# Altium footprint library Connector_art.PcbLib: 209 footprints (part 10 of 14)
Each footprint in its own frame and in the unit in brackets; x right, y up, seen from the top. Pads: shape width x height; smd on the part's side, far side on the other; paste and mask are expansions set on the pad; w line width, h text height; cw(c..) or ccw(c..) is an arc to the next point about the centre after c.
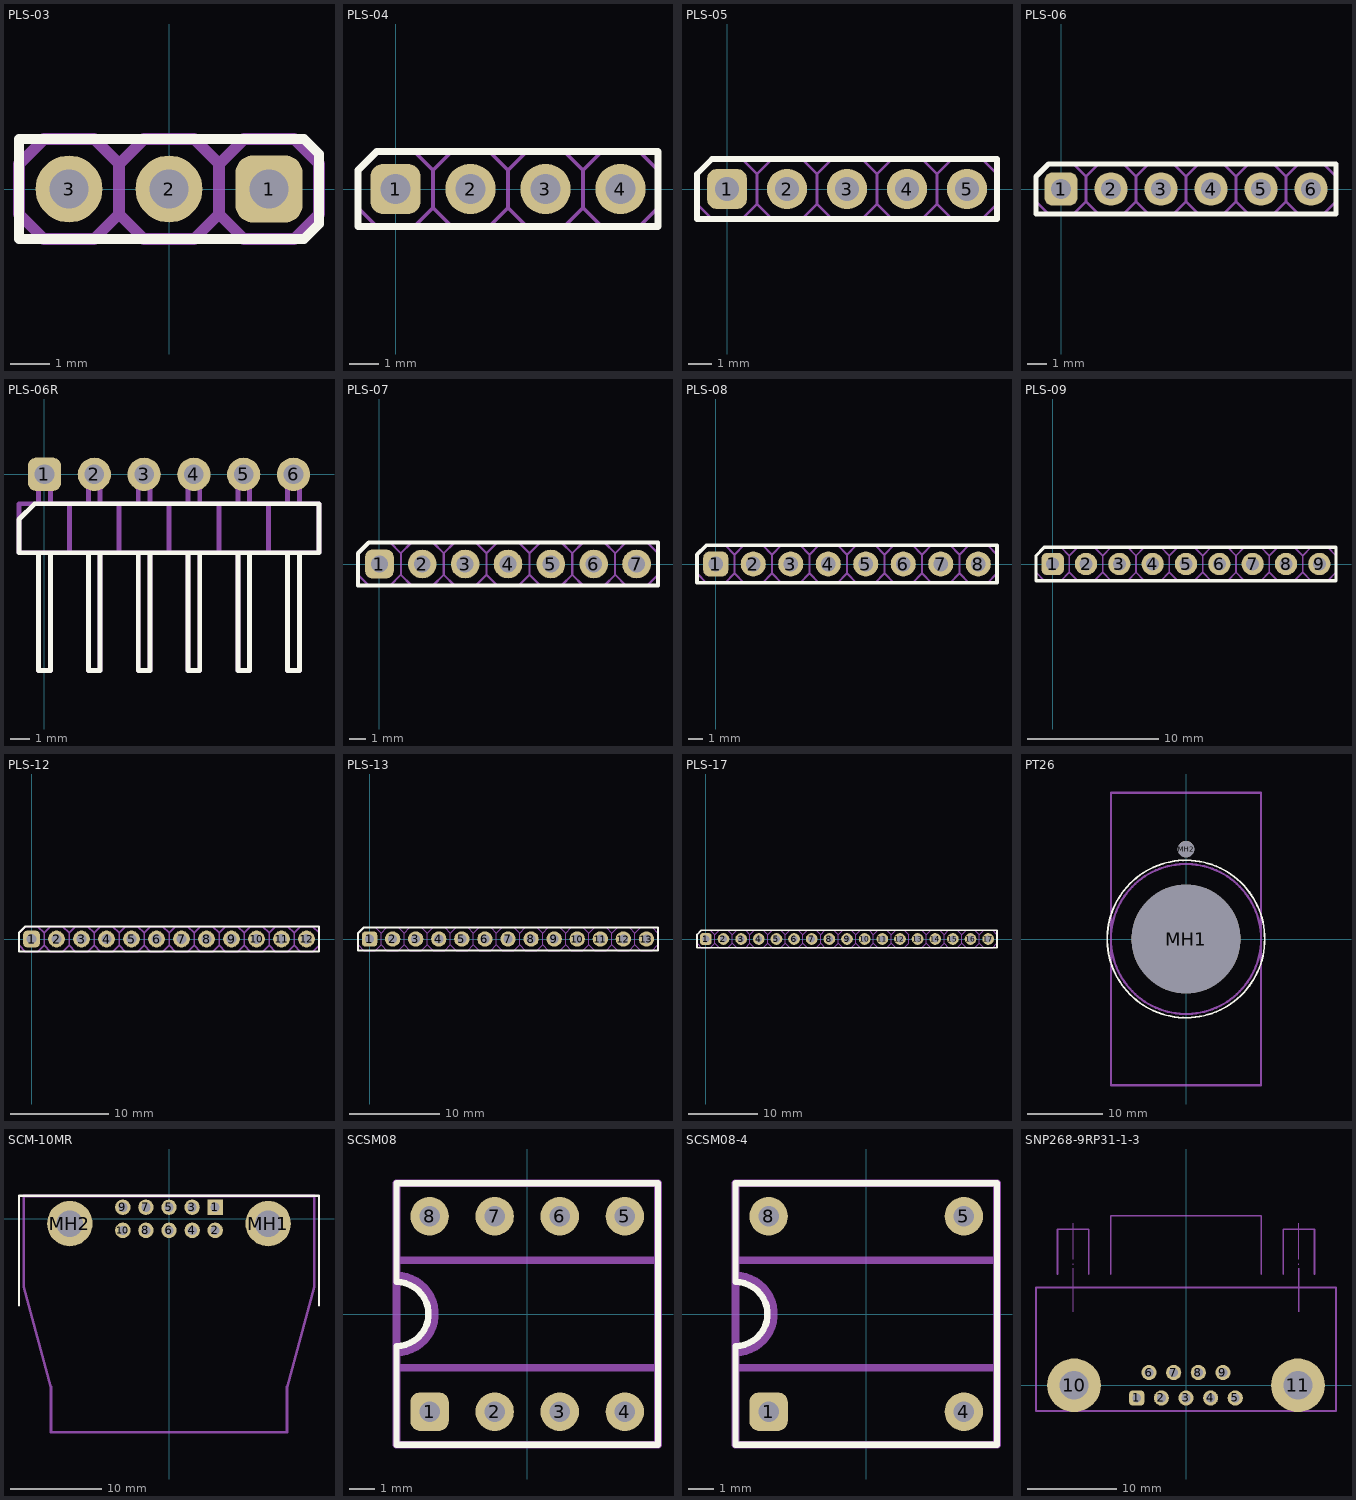
[diagram p9: the footprints below, top view; thin cyan lines are the x and y axes]

## PLS-03 [mm]
height 8.58
pads (3):
  rrect50% 1.7x1.7 hole 1 paste+0: 1(2.54,0)
  round 1.7 hole 1: 2(0,0) 3(-2.54,0)
Top Overlay:
  lines w0.25: -3.81,-1.27 -3.81,1.27 3.429,1.27 3.81,0.889 3.81,-0.889 3.429,-1.27 -3.81,-1.27
Mechanical 1:
  lines w0.3: -1.27,-0.635 -1.905,-1.27 -3.175,-1.27 -3.81,-0.635 -3.81,0.635 -3.175,1.27 -1.905,1.27 -1.27,0.635 ; -1.27,-0.635 -1.27,0.635 ; -1.27,-0.635 -0.635,-1.27 0.635,-1.27 1.27,-0.635 ; -1.27,0.635 -0.635,1.27 0.635,1.27 1.27,0.635 ; 1.27,-0.635 1.905,-1.27 3.175,-1.27 3.81,-0.635 3.81,0.635 3.175,1.27 1.905,1.27 1.27,0.635 ; 1.27,-0.635 1.27,0.635
3D body: height 8.54, standoff -3, extent -3.81,-1.27 3.81,1.27

## PLS-04 [mm]
pads (4):
  rrect50% 1.7x1.7 hole 1: 1(0,0)
  round 1.7 hole 1: 2(2.54,0) 3(5.08,0) 4(7.62,0)
Top Overlay:
  lines w0.25: -1.27,-1.27 -0.635,-1.27 8.89,-1.27 8.89,1.27 -0.635,1.27 -1.27,0.635 -1.27,-1.27
Mechanical 1:
  lines w0.13: 1.27,-0.635 1.905,-1.27 3.175,-1.27 3.81,-0.635 ; 1.27,-0.635 0.635,-1.27 -0.635,-1.27 -1.27,-0.635 -1.27,0.635 -0.635,1.27 0.635,1.27 1.27,0.635 ; 1.27,-0.635 1.27,0.635 ; 1.27,0.635 1.905,1.27 3.175,1.27 3.81,0.635 ; 3.81,-0.635 4.445,-1.27 5.715,-1.27 6.35,-0.635 ; 3.81,-0.635 3.81,0.635 ; 3.81,0.635 4.445,1.27 5.715,1.27 6.35,0.635 ; 6.35,-0.635 6.35,0.635 ; 6.35,-0.635 6.985,-1.27 8.255,-1.27 8.89,-0.635 8.89,0.635 8.255,1.27 6.985,1.27 6.35,0.635
3D body: height 8.54, standoff -3, extent -1.27,-1.27 8.89,1.27

## PLS-05 [mm]
pads (5):
  rrect50% 1.7x1.7 hole 1: 1(0,0)
  round 1.7 hole 1: 2(2.54,0) 3(5.08,0) 4(7.62,0) 5(10.16,0)
Top Overlay:
  lines w0.25: -1.27,-1.27 -0.635,-1.27 11.43,-1.27 11.43,1.27 -0.635,1.27 -1.27,0.635 -1.27,-1.27
Mechanical 1:
  lines w0.13: 1.27,-0.635 1.905,-1.27 3.175,-1.27 3.81,-0.635 ; 1.27,-0.635 0.635,-1.27 -0.635,-1.27 -1.27,-0.635 -1.27,0.635 -0.635,1.27 0.635,1.27 1.27,0.635 ; 1.27,-0.635 1.27,0.635 ; 1.27,0.635 1.905,1.27 3.175,1.27 3.81,0.635 ; 3.81,-0.635 4.445,-1.27 5.715,-1.27 6.35,-0.635 ; 3.81,-0.635 3.81,0.635 ; 3.81,0.635 4.445,1.27 5.715,1.27 6.35,0.635 ; 6.35,-0.635 6.35,0.635 ; 6.35,-0.635 6.985,-1.27 8.255,-1.27 8.89,-0.635 ; 6.35,0.635 6.985,1.27 8.255,1.27 8.89,0.635 ; 8.89,-0.635 8.89,0.635 ; 8.89,-0.635 9.525,-1.27 10.795,-1.27 11.43,-0.635 11.43,0.635 10.795,1.27 9.525,1.27 8.89,0.635
3D body: height 8.54, standoff -3, extent -1.27,-1.27 11.43,1.27

## PLS-06 [mm]
pads (6):
  rrect50% 1.7x1.7 hole 1: 1(0,0)
  round 1.7 hole 1: 2(2.54,0) 3(5.08,0) 4(7.62,0) 5(10.16,0) 6(12.7,0)
Top Overlay:
  lines w0.25: -1.27,-1.27 -1.27,0.635 -0.635,1.27 13.97,1.27 13.97,-1.27 -0.635,-1.27 -1.27,-1.27
Mechanical 1:
  lines w0.13: 1.27,-0.635 1.27,0.635 ; 1.27,-0.635 0.635,-1.27 -0.635,-1.27 -1.27,-0.635 -1.27,0.635 -0.635,1.27 0.635,1.27 1.27,0.635 ; 1.27,-0.635 1.905,-1.27 3.175,-1.27 3.81,-0.635 ; 1.27,0.635 1.905,1.27 3.175,1.27 3.81,0.635 ; 3.81,-0.635 3.81,0.635 ; 3.81,-0.635 4.445,-1.27 5.715,-1.27 6.35,-0.635 ; 3.81,0.635 4.445,1.27 5.715,1.27 6.35,0.635 ; 6.35,-0.635 6.985,-1.27 8.255,-1.27 8.89,-0.635 ; 6.35,-0.635 6.35,0.635 ; 6.35,0.635 6.985,1.27 8.255,1.27 8.89,0.635 ; 8.89,-0.635 9.525,-1.27 10.795,-1.27 11.43,-0.635 ; 8.89,-0.635 8.89,0.635 ; 8.89,0.635 9.525,1.27 10.795,1.27 11.43,0.635 ; 11.43,-0.635 12.065,-1.27 13.335,-1.27 13.97,-0.635 13.97,0.635 13.335,1.27 12.065,1.27 11.43,0.635 ; 11.43,-0.635 11.43,0.635
3D body: height 8.54, standoff -3, extent -1.27,-1.27 13.97,1.27

## PLS-06R [mm]
pads (6):
  rrect50% 1.7x1.7 hole 1: 1(0,0)
  round 1.7 hole 1: 2(2.54,0) 3(5.08,0) 4(7.62,0) 5(10.16,0) 6(12.7,0)
Top Overlay:
  lines w0.25: -0.3,-4 -0.3,-10 0.3,-10 0.3,-4 ; 2.24,-4 2.24,-10 2.84,-10 2.84,-4 ; 4.78,-4 4.78,-10 5.38,-10 5.38,-4 ; 7.32,-4 7.32,-10 7.92,-10 7.92,-4 ; 9.86,-4 9.86,-10 10.46,-10 10.46,-4 ; 12.4,-4 12.4,-10 13,-10 13,-4 ; -1.3,-4 -1.3,-2.3 -0.5,-1.5 14,-1.5 14,-4 -1.3,-4
Mechanical 1:
  lines w0.25: -0.3,-4 -0.3,-10 0.3,-10 0.3,-4 ; -0.3,-1.5 -0.3,0 0.3,0 0.3,-1.5 ; 1.27,-4 1.27,-1.5 ; 2.24,-4 2.24,-10 2.84,-10 2.84,-4 ; 2.24,-1.5 2.24,0 2.84,0 2.84,-1.5 ; 3.81,-4 3.81,-1.5 ; 4.78,-4 4.78,-10 5.38,-10 5.38,-4 ; 4.78,-1.5 4.78,0 5.38,0 5.38,-1.5 ; 6.35,-4 6.35,-1.5 ; 7.32,-4 7.32,-10 7.92,-10 7.92,-4 ; 7.32,-1.5 7.32,0 7.92,0 7.92,-1.5 ; 8.89,-4 8.89,-1.5 ; 9.86,-4 9.86,-10 10.46,-10 10.46,-4 ; 9.86,-1.5 9.86,0 10.46,0 10.46,-1.5 ; 11.43,-4 11.43,-1.5 ; 12.4,-4 12.4,-10 13,-10 13,-4 ; 12.4,-1.5 12.4,0 13,0 13,-1.5 ; -1.3,-4 14,-4 14,-1.5 -1.3,-1.5 -1.3,-4
3D body: height 2.54, standoff -3.21, extent -1.27,-10.04 13.97,0.32

## PLS-07 [mm]
pads (7):
  rrect50% 1.7x1.7 hole 1: 1(0,0)
  round 1.7 hole 1: 2(2.54,0) 3(5.08,0) 4(7.62,0) 5(10.16,0) 6(12.7,0) 7(15.24,0)
Top Overlay:
  lines w0.25: -1.27,-1.27 -0.635,-1.27 16.51,-1.27 16.51,1.27 -0.635,1.27 -1.27,0.635 -1.27,-1.27
Mechanical 1:
  lines w0.13: 1.27,-0.635 1.905,-1.27 3.175,-1.27 3.81,-0.635 ; 1.27,-0.635 0.635,-1.27 -0.635,-1.27 -1.27,-0.635 -1.27,0.635 -0.635,1.27 0.635,1.27 1.27,0.635 ; 1.27,-0.635 1.27,0.635 ; 1.27,0.635 1.905,1.27 3.175,1.27 3.81,0.635 ; 3.81,-0.635 4.445,-1.27 5.715,-1.27 6.35,-0.635 ; 3.81,-0.635 3.81,0.635 ; 3.81,0.635 4.445,1.27 5.715,1.27 6.35,0.635 ; 6.35,-0.635 6.35,0.635 ; 6.35,-0.635 6.985,-1.27 8.255,-1.27 8.89,-0.635 ; 6.35,0.635 6.985,1.27 8.255,1.27 8.89,0.635 ; 8.89,-0.635 8.89,0.635 ; 8.89,-0.635 9.525,-1.27 10.795,-1.27 11.43,-0.635 ; 8.89,0.635 9.525,1.27 10.795,1.27 11.43,0.635 ; 11.43,-0.635 11.43,0.635 ; 11.43,-0.635 12.065,-1.27 13.335,-1.27 13.97,-0.635 ; 11.43,0.635 12.065,1.27 13.335,1.27 13.97,0.635 ; 13.97,-0.635 13.97,0.635 ; 13.97,-0.635 14.605,-1.27 15.875,-1.27 16.51,-0.635 16.51,0.635 15.875,1.27 14.605,1.27 13.97,0.635

## PLS-08 [mm]
pads (8):
  rrect50% 1.7x1.7 hole 1: 1(0,0)
  round 1.7 hole 1: 2(2.54,0) 3(5.08,0) 4(7.62,0) 5(10.16,0) 6(12.7,0) 7(15.24,0) 8(17.78,0)
Top Overlay:
  lines w0.25: -1.27,-1.27 -1.27,0.635 -0.635,1.27 19.05,1.27 19.05,-1.27 -0.635,-1.27 -1.27,-1.27
Mechanical 1:
  lines w0.13: 1.27,-0.635 1.27,0.635 ; 1.27,-0.635 0.635,-1.27 -0.635,-1.27 -1.27,-0.635 -1.27,0.635 -0.635,1.27 0.635,1.27 1.27,0.635 ; 1.27,-0.635 1.905,-1.27 3.175,-1.27 3.81,-0.635 ; 1.27,0.635 1.905,1.27 3.175,1.27 3.81,0.635 ; 3.81,-0.635 3.81,0.635 ; 3.81,-0.635 4.445,-1.27 5.715,-1.27 6.35,-0.635 ; 3.81,0.635 4.445,1.27 5.715,1.27 6.35,0.635 ; 6.35,-0.635 6.985,-1.27 8.255,-1.27 8.89,-0.635 ; 6.35,-0.635 6.35,0.635 ; 6.35,0.635 6.985,1.27 8.255,1.27 8.89,0.635 ; 8.89,-0.635 9.525,-1.27 10.795,-1.27 11.43,-0.635 ; 8.89,-0.635 8.89,0.635 ; 8.89,0.635 9.525,1.27 10.795,1.27 11.43,0.635 ; 11.43,-0.635 12.065,-1.27 13.335,-1.27 13.97,-0.635 ; 11.43,-0.635 11.43,0.635 ; 11.43,0.635 12.065,1.27 13.335,1.27 13.97,0.635 ; 13.97,-0.635 14.605,-1.27 15.875,-1.27 16.51,-0.635 ; 13.97,-0.635 13.97,0.635 ; 13.97,0.635 14.605,1.27 15.875,1.27 16.51,0.635 ; 16.51,-0.635 16.51,0.635 ; 16.51,-0.635 17.145,-1.27 18.415,-1.27 19.05,-0.635 19.05,0.635 18.415,1.27 17.145,1.27 16.51,0.635
3D body: height 8.54, standoff -3, extent -1.27,-1.27 19.05,1.27

## PLS-09 [mm]
pads (9):
  rrect50% 1.7x1.7 hole 1: 1(0,0)
  round 1.7 hole 1: 2(2.54,0) 3(5.08,0) 4(7.62,0) 5(10.16,0) 6(12.7,0) 7(15.24,0) 8(17.78,0) 9(20.32,0)
Top Overlay:
  lines w0.25: -1.27,-1.27 -0.635,-1.27 21.59,-1.27 21.59,1.27 -0.635,1.27 -1.27,0.635 -1.27,-1.27
Mechanical 1:
  lines w0.13: 1.27,-0.635 1.905,-1.27 3.175,-1.27 3.81,-0.635 ; 1.27,-0.635 0.635,-1.27 -0.635,-1.27 -1.27,-0.635 -1.27,0.635 -0.635,1.27 0.635,1.27 1.27,0.635 ; 1.27,-0.635 1.27,0.635 ; 1.27,0.635 1.905,1.27 3.175,1.27 3.81,0.635 ; 3.81,-0.635 4.445,-1.27 5.715,-1.27 6.35,-0.635 ; 3.81,-0.635 3.81,0.635 ; 3.81,0.635 4.445,1.27 5.715,1.27 6.35,0.635 ; 6.35,-0.635 6.35,0.635 ; 6.35,-0.635 6.985,-1.27 8.255,-1.27 8.89,-0.635 ; 6.35,0.635 6.985,1.27 8.255,1.27 8.89,0.635 ; 8.89,-0.635 8.89,0.635 ; 8.89,-0.635 9.525,-1.27 10.795,-1.27 11.43,-0.635 ; 8.89,0.635 9.525,1.27 10.795,1.27 11.43,0.635 ; 11.43,-0.635 11.43,0.635 ; 11.43,-0.635 12.065,-1.27 13.335,-1.27 13.97,-0.635 ; 11.43,0.635 12.065,1.27 13.335,1.27 13.97,0.635 ; 13.97,-0.635 13.97,0.635 ; 13.97,-0.635 14.605,-1.27 15.875,-1.27 16.51,-0.635 ; 13.97,0.635 14.605,1.27 15.875,1.27 16.51,0.635 ; 16.51,-0.635 17.145,-1.27 18.415,-1.27 19.05,-0.635 ; 16.51,-0.635 16.51,0.635 ; 16.51,0.635 17.145,1.27 18.415,1.27 19.05,0.635 ; 19.05,-0.635 19.05,0.635 ; 19.05,-0.635 19.685,-1.27 20.955,-1.27 21.59,-0.635 21.59,0.635 20.955,1.27 19.685,1.27 19.05,0.635

## PLS-12 [mm]
pads (12):
  rrect50% 1.7x1.7 hole 1: 1(0,0)
  round 1.7 hole 1: 2(2.54,0) 3(5.08,0) 4(7.62,0) 5(10.16,0) 6(12.7,0) 7(15.24,0) 8(17.78,0) 9(20.32,0) 10(22.86,0) 11(25.4,0) 12(27.94,0)
Top Overlay:
  lines w0.25: -1.27,-1.27 -0.635,-1.27 29.21,-1.27 29.21,1.27 -0.635,1.27 -1.27,0.635 -1.27,-1.27
Mechanical 1:
  lines w0.13: 1.27,-0.635 1.905,-1.27 3.175,-1.27 3.81,-0.635 ; 1.27,-0.635 0.635,-1.27 -0.635,-1.27 -1.27,-0.635 -1.27,0.635 -0.635,1.27 0.635,1.27 1.27,0.635 ; 1.27,-0.635 1.27,0.635 ; 1.27,0.635 1.905,1.27 3.175,1.27 3.81,0.635 ; 3.81,-0.635 4.445,-1.27 5.715,-1.27 6.35,-0.635 ; 3.81,-0.635 3.81,0.635 ; 3.81,0.635 4.445,1.27 5.715,1.27 6.35,0.635 ; 6.35,-0.635 6.35,0.635 ; 6.35,-0.635 6.985,-1.27 8.255,-1.27 8.89,-0.635 ; 6.35,0.635 6.985,1.27 8.255,1.27 8.89,0.635 ; 8.89,-0.635 8.89,0.635 ; 8.89,-0.635 9.525,-1.27 10.795,-1.27 11.43,-0.635 ; 8.89,0.635 9.525,1.27 10.795,1.27 11.43,0.635 ; 11.43,-0.635 11.43,0.635 ; 11.43,-0.635 12.065,-1.27 13.335,-1.27 13.97,-0.635 ; 11.43,0.635 12.065,1.27 13.335,1.27 13.97,0.635 ; 13.97,-0.635 13.97,0.635 ; 13.97,-0.635 14.605,-1.27 15.875,-1.27 16.51,-0.635 ; 13.97,0.635 14.605,1.27 15.875,1.27 16.51,0.635 ; 16.51,-0.635 17.145,-1.27 18.415,-1.27 19.05,-0.635 ; 16.51,-0.635 16.51,0.635 ; 16.51,0.635 17.145,1.27 18.415,1.27 19.05,0.635 ; 19.05,-0.635 19.05,0.635 ; 19.05,-0.635 19.685,-1.27 20.955,-1.27 21.59,-0.635 ; 19.05,0.635 19.685,1.27 20.955,1.27 21.59,0.635 ; 21.59,-0.635 22.225,-1.27 23.495,-1.27 24.13,-0.635 ; 21.59,-0.635 21.59,0.635 ; 21.59,0.635 22.225,1.27 23.495,1.27 24.13,0.635 ; 24.13,-0.635 24.765,-1.27 26.035,-1.27 26.67,-0.635 ; 24.13,-0.635 24.13,0.635 ; 24.13,0.635 24.765,1.27 26.035,1.27 26.67,0.635 ; 26.67,-0.635 26.67,0.635 ; 26.67,-0.635 27.305,-1.27 28.575,-1.27 29.21,-0.635 29.21,0.635 28.575,1.27 27.305,1.27 26.67,0.635
3D body: height 8.54, standoff -3, extent -1.27,-1.27 29.21,1.27

## PLS-13 [mm]
pads (13):
  rrect50% 1.7x1.7 hole 1: 1(0,0)
  round 1.7 hole 1: 2(2.54,0) 3(5.08,0) 4(7.62,0) 5(10.16,0) 6(12.7,0) 7(15.24,0) 8(17.78,0) 9(20.32,0) 10(22.86,0) 11(25.4,0) 12(27.94,0) 13(30.48,0)
Top Overlay:
  lines w0.25: -1.27,-1.27 -1.27,0.635 -0.635,1.27 31.75,1.27 31.75,-1.27 -0.635,-1.27 -1.27,-1.27
Mechanical 1:
  lines w0.13: 1.27,-0.635 1.27,0.635 ; 1.27,-0.635 0.635,-1.27 -0.635,-1.27 -1.27,-0.635 -1.27,0.635 -0.635,1.27 0.635,1.27 1.27,0.635 ; 1.27,-0.635 1.905,-1.27 3.175,-1.27 3.81,-0.635 ; 1.27,0.635 1.905,1.27 3.175,1.27 3.81,0.635 ; 3.81,-0.635 3.81,0.635 ; 3.81,-0.635 4.445,-1.27 5.715,-1.27 6.35,-0.635 ; 3.81,0.635 4.445,1.27 5.715,1.27 6.35,0.635 ; 6.35,-0.635 6.985,-1.27 8.255,-1.27 8.89,-0.635 ; 6.35,-0.635 6.35,0.635 ; 6.35,0.635 6.985,1.27 8.255,1.27 8.89,0.635 ; 8.89,-0.635 9.525,-1.27 10.795,-1.27 11.43,-0.635 ; 8.89,-0.635 8.89,0.635 ; 8.89,0.635 9.525,1.27 10.795,1.27 11.43,0.635 ; 11.43,-0.635 12.065,-1.27 13.335,-1.27 13.97,-0.635 ; 11.43,-0.635 11.43,0.635 ; 11.43,0.635 12.065,1.27 13.335,1.27 13.97,0.635 ; 13.97,-0.635 14.605,-1.27 15.875,-1.27 16.51,-0.635 ; 13.97,-0.635 13.97,0.635 ; 13.97,0.635 14.605,1.27 15.875,1.27 16.51,0.635 ; 16.51,-0.635 16.51,0.635 ; 16.51,-0.635 17.145,-1.27 18.415,-1.27 19.05,-0.635 ; 16.51,0.635 17.145,1.27 18.415,1.27 19.05,0.635 ; 19.05,-0.635 19.685,-1.27 20.955,-1.27 21.59,-0.635 ; 19.05,-0.635 19.05,0.635 ; 19.05,0.635 19.685,1.27 20.955,1.27 21.59,0.635 ; 21.59,-0.635 21.59,0.635 ; 21.59,-0.635 22.225,-1.27 23.495,-1.27 24.13,-0.635 ; 21.59,0.635 22.225,1.27 23.495,1.27 24.13,0.635 ; 24.13,-0.635 24.13,0.635 ; 24.13,-0.635 24.765,-1.27 26.035,-1.27 26.67,-0.635 ; 24.13,0.635 24.765,1.27 26.035,1.27 26.67,0.635 ; 26.67,-0.635 27.305,-1.27 28.575,-1.27 29.21,-0.635 ; 26.67,-0.635 26.67,0.635 ; 26.67,0.635 27.305,1.27 28.575,1.27 29.21,0.635 ; 29.21,-0.635 29.845,-1.27 31.115,-1.27 31.75,-0.635 31.75,0.635 31.115,1.27 29.845,1.27 29.21,0.635 ; 29.21,-0.635 29.21,0.635
3D body: height 8.54, standoff -3, extent -1.27,-1.27 31.75,1.27

## PLS-17 [mm]
pads (17):
  rrect50% 1.7x1.7 hole 1: 1(0,0)
  round 1.7 hole 1: 2(2.54,0) 3(5.08,0) 4(7.62,0) 5(10.16,0) 6(12.7,0) 7(15.24,0) 8(17.78,0) 9(20.32,0) 10(22.86,0) 11(25.4,0) 12(27.94,0) 13(30.48,0) 14(33.02,0) 15(35.56,0) 16(38.1,0) 17(40.64,0)
Top Overlay:
  lines w0.25: -1.27,-1.27 -1.27,0.635 -0.635,1.27 41.91,1.27 41.91,-1.27 -0.635,-1.27 -1.27,-1.27
Mechanical 1:
  lines w0.13: 29.845,-1.27 31.115,-1.27 31.75,-0.635 ; 29.845,1.27 31.115,1.27 31.75,0.635 ; 1.27,-0.635 1.27,0.635 ; 1.27,-0.635 0.635,-1.27 -0.635,-1.27 -1.27,-0.635 -1.27,0.635 -0.635,1.27 0.635,1.27 1.27,0.635 ; 1.27,-0.635 1.905,-1.27 3.175,-1.27 3.81,-0.635 ; 1.27,0.635 1.905,1.27 3.175,1.27 3.81,0.635 ; 3.81,-0.635 3.81,0.635 ; 3.81,-0.635 4.445,-1.27 5.715,-1.27 6.35,-0.635 ; 3.81,0.635 4.445,1.27 5.715,1.27 6.35,0.635 ; 6.35,-0.635 6.985,-1.27 8.255,-1.27 8.89,-0.635 ; 6.35,-0.635 6.35,0.635 ; 6.35,0.635 6.985,1.27 8.255,1.27 8.89,0.635 ; 8.89,-0.635 9.525,-1.27 10.795,-1.27 11.43,-0.635 ; 8.89,-0.635 8.89,0.635 ; 8.89,0.635 9.525,1.27 10.795,1.27 11.43,0.635 ; 11.43,-0.635 12.065,-1.27 13.335,-1.27 13.97,-0.635 ; 11.43,-0.635 11.43,0.635 ; 11.43,0.635 12.065,1.27 13.335,1.27 13.97,0.635 ; 13.97,-0.635 14.605,-1.27 15.875,-1.27 16.51,-0.635 ; 13.97,-0.635 13.97,0.635 ; 13.97,0.635 14.605,1.27 15.875,1.27 16.51,0.635 ; 16.51,-0.635 16.51,0.635 ; 16.51,-0.635 17.145,-1.27 18.415,-1.27 19.05,-0.635 ; 16.51,0.635 17.145,1.27 18.415,1.27 19.05,0.635 ; 19.05,-0.635 19.685,-1.27 20.955,-1.27 21.59,-0.635 ; 19.05,-0.635 19.05,0.635 ; 19.05,0.635 19.685,1.27 20.955,1.27 21.59,0.635 ; 21.59,-0.635 21.59,0.635 ; 21.59,-0.635 22.225,-1.27 23.495,-1.27 24.13,-0.635 ; 21.59,0.635 22.225,1.27 23.495,1.27 24.13,0.635 ; 24.13,-0.635 24.13,0.635 ; 24.13,-0.635 24.765,-1.27 26.035,-1.27 26.67,-0.635 ; 24.13,0.635 24.765,1.27 26.035,1.27 26.67,0.635 ; 26.67,-0.635 27.305,-1.27 28.575,-1.27 29.21,-0.635 29.21,0.635 28.575,1.27 27.305,1.27 26.67,0.635 ; 26.67,-0.635 26.67,0.635 ; 31.75,-0.635 31.75,0.635 ; 31.75,-0.635 32.385,-1.27 33.655,-1.27 34.29,-0.635 ; 31.75,0.635 32.385,1.27 33.655,1.27 34.29,0.635 ; 34.29,-0.635 34.29,0.635 ; 34.29,-0.635 34.925,-1.27 36.195,-1.27 36.83,-0.635 ; 34.29,0.635 34.925,1.27 36.195,1.27 36.83,0.635 ; 36.83,-0.635 36.83,0.635 ; 36.83,-0.635 37.465,-1.27 38.735,-1.27 39.37,-0.635 ; 36.83,0.635 37.465,1.27 38.735,1.27 39.37,0.635 ; 39.37,-0.635 39.37,0.635 ; 39.37,-0.635 40.005,-1.27 41.275,-1.27 41.91,-0.635 41.91,0.635 41.275,1.27 40.005,1.27 39.37,0.635
3D body: height 8.54, standoff -3, extent -1.27,-1.27 41.91,1.27

## PT26 [mm]
height 26
pads (2):
  round 14.5 hole 14.5 unplated: MH1(0,0)
  round 2.2 hole 2.2 unplated: MH2(0,12)
Top Overlay:
  circle w0.25: c0,0 r10.5
Bottom Overlay:
  lines w0.3: -10.5,-20 -10.5,20 10.5,20 10.5,-20 -10.5,-20
Mechanical 1:
  circle w0.3: c0,0 r10
  lines w0.3: -10,-19.5 -10,19.5 10,19.5 10,-19.5 -10,-19.5
3D body: height 28.59, standoff -29.5, extent -10,-19.5 10,19.5

## SCM-10MR [mm]
height 8.5
pads (12):
  rect 1.7x1.7 hole 1: 1(5.08,1.27)
  round 1.7 hole 1: 2(5.08,-1.27) 3(2.54,1.27) 4(2.56,-1.27) 5(0,1.27) 6(0,-1.27) 7(-2.54,1.27) 8(-2.54,-1.27) 9(-5.08,1.27) 10(-5.08,-1.27)
  round 5 hole 2.9: MH1(10.92,-0.53) MH2(-10.92,-0.53)
Top Overlay:
  lines w0.25: -16.51,-9.525 -16.51,2.54 16.51,2.54 16.51,-9.525
Mechanical 1:
  lines w0.3: -16,-7.5 -13,-18.5 -13,-23.5 13,-23.5 13,-18.5 16,-7.5 16,2.5 -16,2.5 -16,-7.5
3D body: height 8.5, standoff -3.2, extent -16.147,-23.43 16.153,2.32

## SCSM08 [mm]
height 4.5
pads (8):
  rrect50% 1.5x1.5 hole 0.8: 1(-3.81,-3.81)
  round 1.5 hole 0.8: 2(-1.27,-3.81) 3(1.27,-3.81) 4(3.81,-3.81) 5(3.81,3.81) 6(1.27,3.81) 7(-1.27,3.81) 8(-3.81,3.81)
Top Overlay:
  lines w0.25: -5.1,-5.1 5.1,-5.1 5.1,5.1 -5.1,5.1 -5.1,1.25 cw(c-5.1,0) -5.1,-1.25 -5.1,-5.1
Mechanical 1:
  lines w0.3: -5.1,-2.1 5.1,-2.1 ; -5.1,-1.5 ccw(c-5.1,0) -5.1,1.5 ; -5.1,2.1 5.1,2.1 ; -5.1,-5.1 5.1,-5.1 5.1,5.1 -5.1,5.1 -5.1,-5.1
3D body: height 4.4, standoff -3, extent -5.1,-5.1 5.1,5.1

## SCSM08-4 [mm]
height 4.5
pads (4):
  rrect50% 1.5x1.5 hole 0.8: 1(-3.81,-3.81)
  round 1.5 hole 0.8: 4(3.81,-3.81) 5(3.81,3.81) 8(-3.81,3.81)
Top Overlay:
  lines w0.25: -5.1,-5.1 5.1,-5.1 5.1,5.1 -5.1,5.1 -5.1,1.25 cw(c-5.1,0) -5.1,-1.25 -5.1,-5.1
Mechanical 1:
  lines w0.3: -5.1,-2.1 5.1,-2.1 ; -5.1,-1.5 ccw(c-5.1,0) -5.1,1.5 ; -5.1,2.1 5.1,2.1 ; -5.1,-5.1 5.1,-5.1 5.1,5.1 -5.1,5.1 -5.1,-5.1
3D body: height 4.4, standoff -3, extent -5.1,-5.1 5.1,5.1

## SNP268-9RP31-1-3 [mm]
height 12.6
pads (11):
  rrect50% 1.7x1.7 hole 1: 1(-5.5,-1.42)
  round 1.7 hole 1: 2(-2.75,-1.42) 3(0,-1.42) 4(2.75,-1.42) 5(5.5,-1.42) 6(-4.125,1.42) 7(-1.375,1.42) 8(1.375,1.42) 9(4.125,1.42)
  round 6 hole 3.2: 10(-12.5,0) 11(12.5,0)
Mechanical 1:
  circle w0.2: c12.465,-0.055 r1.6
  circle w0.2: c-12.5,-0.08 r1.6
  lines w0.1: -14.62,0 -10.39,0 ; -12.6,8.22 -12.6,13.055 ; -12.6,13.485 -12.6,13.58 ; -12.6,14.095 -12.6,18.12 ; -12.5,2.32 -12.495,-2.32 ; 10.08,-0.005 14.875,0 ; 12.505,2.45 12.51,-2.42 ; 12.595,13.045 12.6,8.21 ; 12.595,13.475 12.595,13.57 ; 12.595,14.085 12.595,18.11
  lines w0.2: -14.35,12.42 -14.35,17.42 -10.85,17.42 -10.85,12.42 ; -8.4,12.42 -8.4,18.92 8.4,18.92 8.4,12.42 ; 10.85,12.42 10.85,17.42 14.35,17.42 14.35,12.42 ; -16.75,-2.88 16.75,-2.88 16.75,10.92 -16.75,10.92 -16.75,-2.88
  text "5" at 6.831,-2.224 h1.5
  text "1" at -8.149,-2.179 h1.5
  text "9" at 6.831,0.616 h1.5
  text "6" at -8.149,0.571 h1.5
Mechanical 2:
  circle w0.2: c12.47,-0.055 r1.6
  circle w0.2: c-12.5,-0.08 r1.6
  lines w0.1: -14.635,0 -10.375,0 ; -12.6,8.22 -12.6,13.055 ; -12.6,13.485 -12.6,13.58 ; -12.6,14.095 -12.6,18.12 ; -12.5,-2.265 -12.5,2.31 ; 10.09,0 14.875,0 ; 12.5,-2.32 12.505,2.42 ; 12.595,8.21 12.595,13.045 ; 12.595,13.475 12.595,13.57 ; 12.595,14.085 12.595,18.11
  lines w0.2: -14.35,12.42 -14.35,17.42 -10.85,17.42 -10.85,12.42 ; -8.4,12.42 -8.4,18.92 8.4,18.92 8.4,12.42 ; 10.85,12.42 10.85,17.42 14.35,17.42 14.35,12.42 ; -16.75,-2.88 16.75,-2.88 16.75,10.92 -16.75,10.92 -16.75,-2.88
3D body: height 13.6, standoff -3.2, extent -15.6,-3.33 15.6,17.87